# Altium footprint library myLibraryAltium.PcbLib: 215 footprints (part 6 of 14)
Each footprint in its own frame and in the unit in brackets; x right, y up, seen from the top. Pads: shape width x height; smd on the part's side, far side on the other; paste and mask are expansions set on the pad; w line width, h text height; cw(c..) or ccw(c..) is an arc to the next point about the centre after c.
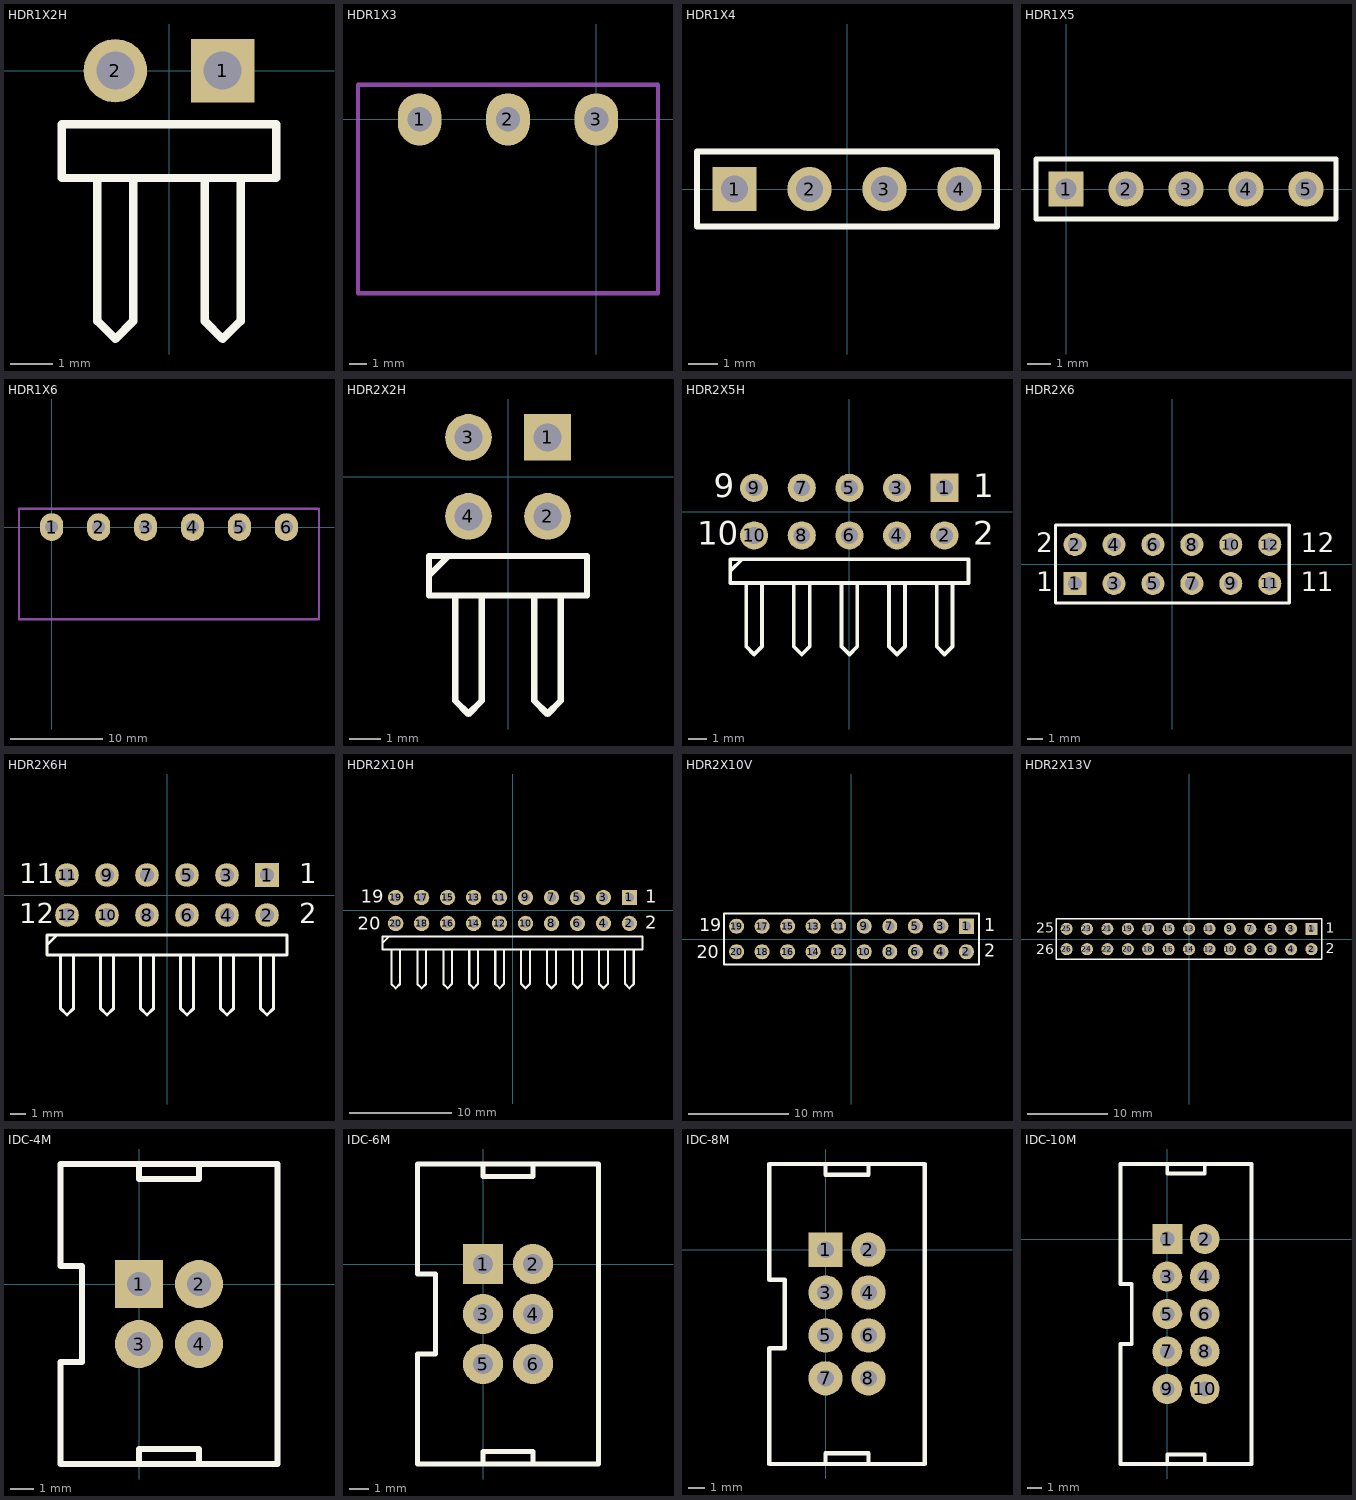
[diagram p5: the footprints below, top view; thin cyan lines are the x and y axes]

## HDR1X2H [mm] "Connector; Header; 2 Position; Right Angle"
pads (2):
  rect 1.5x1.5 hole 0.9: 1(1.27,0)
  round 1.5 hole 0.9: 2(-1.27,0)
Top Overlay:
  lines w0.2: -1.693,-2.54 -1.693,-5.927 -1.27,-6.35 -0.847,-5.927 -0.847,-2.54 ; 0.847,-2.54 0.847,-5.927 1.27,-6.35 1.693,-5.927 1.693,-2.54 ; -2.54,-2.54 2.54,-2.54 2.54,-1.27 -2.54,-1.27 -2.54,-2.54

## HDR1X3 [mm] "Connector; Header; 3 Position"
pads (3):
  oval 2.5x3 hole 1.4: 1(-10.16,0) 2(-5.08,0) 3(0,0)
Mechanical 1:
  lines w0.254: -13.7,-10 3.54,-10 3.54,1.981 ; -13.7,-9.931 -13.7,2 ; -13.691,2 3.54,2

## HDR1X4 [mm] "Connector; Header; 4 Position"
pads (4):
  rect 1.5x1.5 hole 0.9: 1(-3.81,0)
  round 1.5 hole 0.9: 2(-1.27,0) 3(1.27,0) 4(3.81,0)
Top Overlay:
  lines w0.2: -5.08,-1.27 -5.08,1.27 5.08,1.27 5.08,-1.27 -5.08,-1.27

## HDR1X5 [mm]
height 1
pads (5):
  rect 1.5x1.5 hole 0.9: 1(0,0)
  round 1.5 hole 0.9: 2(2.54,0) 3(5.08,0) 4(7.62,0) 5(10.16,0)
Top Overlay:
  lines w0.2: -1.27,-1.27 -1.27,1.27 11.43,1.27 11.43,-1.27 -1.27,-1.27

## HDR1X6 [mm] "Connector; Header; 6 Position"
pads (6):
  oval 2.5x3 hole 1.4: 1(0,0) 2(5.08,0) 3(10.16,0) 4(15.24,0) 5(20.32,0) 6(25.4,0)
Mechanical 1:
  lines w0.254: 28.94,1.956 28.94,-10 -3.54,-10 -3.54,-9.742 -3.54,2 28.94,2

## HDR2X2H [mm] "Connector; Header; 2x2 Position; Right Angle"
pads (4):
  rect 1.5x1.5 hole 0.9: 1(1.27,1.27)
  round 1.5 hole 0.9: 2(1.27,-1.27) 3(-1.27,1.27) 4(-1.27,-1.27)
Top Overlay:
  lines w0.2: -2.54,-3.175 -1.905,-2.54 ; -1.693,-3.81 -1.693,-7.197 -1.27,-7.62 -0.847,-7.197 -0.847,-3.81 ; 0.847,-3.81 0.847,-7.197 1.27,-7.62 1.693,-7.197 1.693,-3.81 ; -2.54,-3.81 2.54,-3.81 2.54,-2.54 -2.54,-2.54 -2.54,-3.81

## HDR2X5H [mm] "Connector; Header; 5x2 Position; Right Angle"
pads (10):
  rect 1.5x1.5 hole 0.9: 1(5.08,1.27)
  round 1.5 hole 0.9: 2(5.08,-1.27) 3(2.54,1.27) 4(2.54,-1.27) 5(0,1.27) 6(0,-1.27) 7(-2.54,1.27) 8(-2.54,-1.27) 9(-5.08,1.27) 10(-5.08,-1.27)
Top Overlay:
  lines w0.2: -6.35,-3.175 -5.715,-2.54 ; -5.503,-3.81 -5.503,-7.197 -5.08,-7.62 -4.657,-7.197 -4.657,-3.81 ; -2.963,-3.81 -2.963,-7.197 -2.54,-7.62 -2.117,-7.197 -2.117,-3.81 ; -0.423,-3.81 -0.423,-7.197 0,-7.62 0.423,-7.197 0.423,-3.81 ; 2.117,-3.81 2.117,-7.197 2.54,-7.62 2.963,-7.197 2.963,-3.81 ; 4.657,-3.81 4.657,-7.197 5.08,-7.62 5.503,-7.197 5.503,-3.81 ; -6.35,-3.81 -6.35,-2.54 6.35,-2.54 6.35,-3.81 -6.35,-3.81
  text "1" at 6.604,0.762 h1.27
  text "2" at 6.604,-1.778 h1.27
  text "10" at -8.128,-1.778 h1.27
  text "9" at -7.239,0.762 h1.27

## HDR2X6 [mm] "Connector; Header; 6x2 Position"
pads (12):
  rect 1.5x1.5 hole 0.9: 1(-6.35,-1.27)
  round 1.5 hole 0.9: 2(-6.35,1.27) 3(-3.81,-1.27) 4(-3.81,1.27) 5(-1.27,-1.27) 6(-1.27,1.27) 7(1.27,-1.27) 8(1.27,1.27) 9(3.81,-1.27) 10(3.81,1.27) 11(6.35,-1.27) 12(6.35,1.27)
Top Overlay:
  lines w0.2: -7.62,-2.54 -7.62,2.54 7.62,2.54 7.62,-2.54 -7.62,-2.54
  text "2" at -8.89,0.762 h1.27
  text "1" at -8.89,-1.778 h1.27
  text "1" at 8.382,-1.778 h1.27
  text "1" at 9.398,-1.778 h1.27
  text "12" at 8.382,0.762 h1.27

## HDR2X6H [mm] "Connector; Header; 6x2 Position; Right Angle"
pads (12):
  rect 1.5x1.5 hole 0.9: 1(6.35,1.27)
  round 1.5 hole 0.9: 2(6.35,-1.27) 3(3.81,1.27) 4(3.81,-1.27) 5(1.27,1.27) 6(1.27,-1.27) 7(-1.27,1.27) 8(-1.27,-1.27) 9(-3.81,1.27) 10(-3.81,-1.27) 11(-6.35,1.27) 12(-6.35,-1.27)
Top Overlay:
  lines w0.2: -7.62,-3.175 -6.985,-2.54 ; -6.773,-3.81 -6.773,-7.197 -6.35,-7.62 -5.927,-7.197 -5.927,-3.81 ; -4.233,-3.81 -4.233,-7.197 -3.81,-7.62 -3.387,-7.197 -3.387,-3.81 ; -1.693,-3.81 -1.693,-7.197 -1.27,-7.62 -0.847,-7.197 -0.847,-3.81 ; 0.847,-3.81 0.847,-7.197 1.27,-7.62 1.693,-7.197 1.693,-3.81 ; 3.387,-3.81 3.387,-7.197 3.81,-7.62 4.233,-7.197 4.233,-3.81 ; 5.927,-3.81 5.927,-7.197 6.35,-7.62 6.773,-7.197 6.773,-3.81 ; -7.62,-3.81 7.62,-3.81 7.62,-2.54 -7.62,-2.54 -7.62,-3.81
  text "11" at -9.398,0.762 h1.27
  text "12" at -9.398,-1.778 h1.27
  text "2" at 8.382,-1.778 h1.27
  text "1" at 8.382,0.762 h1.27

## HDR2X10H [mm] "Connector; Header; 10x2 Position; Right Angle"
pads (20):
  rect 1.5x1.5 hole 0.9: 1(11.43,1.27)
  round 1.5 hole 0.9: 2(11.43,-1.27) 3(8.89,1.27) 4(8.89,-1.27) 5(6.35,1.27) 6(6.35,-1.27) 7(3.81,1.27) 8(3.81,-1.27) 9(1.27,1.27) 10(1.27,-1.27) 11(-1.27,1.27) 12(-1.27,-1.27) 13(-3.81,1.27) 14(-3.81,-1.27) 15(-6.35,1.27) 16(-6.35,-1.27) 17(-8.89,1.27) 18(-8.89,-1.27) 19(-11.43,1.27) 20(-11.43,-1.27)
Top Overlay:
  lines w0.2: -12.7,-3.175 -12.065,-2.54 ; -11.853,-3.81 -11.853,-7.197 -11.43,-7.62 -11.007,-7.197 -11.007,-3.81 ; -9.313,-3.81 -9.313,-7.197 -8.89,-7.62 -8.467,-7.197 -8.467,-3.81 ; -6.773,-3.81 -6.773,-7.197 -6.35,-7.62 -5.927,-7.197 -5.927,-3.81 ; -4.233,-3.81 -4.233,-7.197 -3.81,-7.62 -3.387,-7.197 -3.387,-3.81 ; -1.693,-3.81 -1.693,-7.197 -1.27,-7.62 -0.847,-7.197 -0.847,-3.81 ; 0.847,-3.81 0.847,-7.197 1.27,-7.62 1.693,-7.197 1.693,-3.81 ; 3.387,-3.81 3.387,-7.197 3.81,-7.62 4.233,-7.197 4.233,-3.81 ; 5.927,-3.81 5.927,-7.197 6.35,-7.62 6.773,-7.197 6.773,-3.81 ; 8.467,-3.81 8.467,-7.197 8.89,-7.62 9.313,-7.197 9.313,-3.81 ; 11.007,-3.81 11.007,-7.197 11.43,-7.62 11.853,-7.197 11.853,-3.81 ; -12.7,-3.81 12.7,-3.81 12.7,-2.54 -12.7,-2.54 -12.7,-3.81
  text "1" at 12.954,0.762 h1.27
  text "2" at 12.954,-1.778 h1.27
  text "19" at -14.859,0.762 h1.27
  text "20" at -15.113,-1.905 h1.27

## HDR2X10V [mm] "Connector; Header; 10x2 Position; Right Angle"
pads (20):
  rect 1.5x1.5 hole 0.9: 1(11.43,1.27)
  round 1.5 hole 0.9: 2(11.43,-1.27) 3(8.89,1.27) 4(8.89,-1.27) 5(6.35,1.27) 6(6.35,-1.27) 7(3.81,1.27) 8(3.81,-1.27) 9(1.27,1.27) 10(1.27,-1.27) 11(-1.27,1.27) 12(-1.27,-1.27) 13(-3.81,1.27) 14(-3.81,-1.27) 15(-6.35,1.27) 16(-6.35,-1.27) 17(-8.89,1.27) 18(-8.89,-1.27) 19(-11.43,1.27) 20(-11.43,-1.27)
Top Overlay:
  lines w0.2: -12.7,-2.54 -12.7,2.54 12.7,2.54 12.7,-2.54 -12.7,-2.54
  text "1" at 13.208,0.762 h1.27
  text "2" at 13.208,-1.778 h1.27
  text "19" at -15.138,0.762 h1.27
  text "20" at -15.367,-1.905 h1.27
3D body "User Library-Pin Header 2X10.STEP": height 7.98, standoff -3.02, extent -12.7,-2.565 12.7,2.515

## HDR2X13V [mm] "Connector; Header; 10x2 Position; Right Angle"
pads (26):
  rect 1.5x1.5 hole 0.9: 1(15.24,1.27)
  round 1.5 hole 0.9: 2(15.24,-1.27) 3(12.7,1.27) 4(12.7,-1.27) 5(10.16,1.27) 6(10.16,-1.27) 7(7.62,1.27) 8(7.62,-1.27) 9(5.08,1.27) 10(5.08,-1.27) 11(2.54,1.27) 12(2.54,-1.27) 13(0,1.27) 14(0,-1.27) 15(-2.54,1.27) 16(-2.54,-1.27) 17(-5.08,1.27) 18(-5.08,-1.27) 19(-7.62,1.27) 20(-7.62,-1.27) 21(-10.16,1.27) 22(-10.16,-1.27) 23(-12.7,1.27) 24(-12.7,-1.27) 25(-15.24,1.27) 26(-15.24,-1.27)
Top Overlay:
  lines w0.2: -16.51,-2.54 -16.51,2.54 16.51,2.54 16.51,-2.54 -16.51,-2.54
  text "1" at 17.018,0.762 h1.27
  text "2" at 17.018,-1.778 h1.27
  text "25" at -19.046,0.762 h1.27
  text "26" at -19.042,-1.905 h1.27
3D body "User Library-1x2 TH Pitch 2_54mm.step": height 9.5, standoff -3.2, extent -16.51,-2.54 -13.97,2.54
3D body "User Library-1x2 TH Pitch 2_54mm.step": height 9.5, standoff -3.2, extent -13.97,-2.54 -11.43,2.54
3D body "User Library-1x2 TH Pitch 2_54mm.step": height 9.5, standoff -3.2, extent -11.43,-2.54 -8.89,2.54
3D body "User Library-1x2 TH Pitch 2_54mm.step": height 9.5, standoff -3.2, extent -8.89,-2.54 -6.35,2.54
3D body "User Library-1x2 TH Pitch 2_54mm.step": height 9.5, standoff -3.2, extent -6.35,-2.54 -3.81,2.54
3D body "User Library-1x2 TH Pitch 2_54mm.step": height 9.5, standoff -3.2, extent -3.81,-2.54 -1.27,2.54
3D body "User Library-1x2 TH Pitch 2_54mm.step": height 9.5, standoff -3.2, extent -1.27,-2.54 1.27,2.54
3D body "User Library-1x2 TH Pitch 2_54mm.step": height 9.5, standoff -3.2, extent 1.27,-2.54 3.81,2.54
3D body "User Library-1x2 TH Pitch 2_54mm.step": height 9.5, standoff -3.2, extent 3.81,-2.54 6.35,2.54
3D body "User Library-1x2 TH Pitch 2_54mm.step": height 9.5, standoff -3.2, extent 6.35,-2.54 8.89,2.54
3D body "User Library-1x2 TH Pitch 2_54mm.step": height 9.5, standoff -3.2, extent 8.89,-2.54 11.43,2.54
3D body "User Library-1x2 TH Pitch 2_54mm.step": height 9.5, standoff -3.2, extent 11.43,-2.54 13.97,2.54
3D body "User Library-1x2 TH Pitch 2_54mm.step": height 9.5, standoff -3.2, extent 13.97,-2.54 16.51,2.54

## IDC-4M [mil]
pads (4):
  rect 80x80 hole 39.37: 1(0,0)
  round 80 hole 39.37: 2(100,0) 3(0,-100) 4(100,-100)
Top Overlay:
  lines w10: 0,-300 0,-275 100,-275 100,-300 ; 0,200 0,175 100,175 100,200 ; -131.1,-300 231.1,-300 231.1,200 -131.1,200 -131.1,30 -95,30 -95,-130 -131.1,-130 -131.1,-300

## IDC-6M [mil]
pads (6):
  rect 80x80 hole 39.37: 1(0,0)
  round 80 hole 39.37: 2(100,0) 3(0,-100) 4(100,-100) 5(0,-200) 6(100,-200)
Top Overlay:
  lines w10: 0,-400 0,-375 100,-375 100,-400 ; 0,200 0,175 100,175 100,200 ; -131.1,-400 231.1,-400 231.1,200 -131.1,200 -131.1,-20 -95,-20 -95,-180 -131.1,-180 -131.1,-400

## IDC-8M [mil]
pads (8):
  rect 80x80 hole 39.37: 1(0,0)
  round 80 hole 39.37: 2(100,0) 3(0,-100) 4(100,-100) 5(0,-200) 6(100,-200) 7(0,-300) 8(100,-300)
Top Overlay:
  lines w10: 0,-500 0,-475 100,-475 100,-500 ; 0,200 0,175 100,175 100,200 ; -131.1,-500 -131.1,-230 -95,-230 -95,-70 -131.1,-70 -131.1,200 231.1,200 231.1,-500 -131.1,-500

## IDC-10M [mil]
pads (10):
  rect 80x80 hole 39.37: 1(0,0)
  round 80 hole 39.37: 2(100,0) 3(0,-100) 4(100,-100) 5(0,-200) 6(100,-200) 7(0,-300) 8(100,-300) 9(0,-400) 10(100,-400)
Top Overlay:
  lines w10: 0,-600 0,-575 100,-575 100,-600 ; 0,200 0,175 100,175 100,200 ; -125,-600 225,-600 225,200 -125,200 -125,-120 -95,-120 -95,-280 -125,-280 -125,-600